# Altium footprint library UWRT_Footprint_Library_2020.PcbLib: 376 footprints (part 7 of 24)
Each footprint in its own frame and in the unit in brackets; x right, y up, seen from the top. Pads: shape width x height; smd on the part's side, far side on the other; paste and mask are expansions set on the pad; w line width, h text height; cw(c..) or ccw(c..) is an arc to the next point about the centre after c.
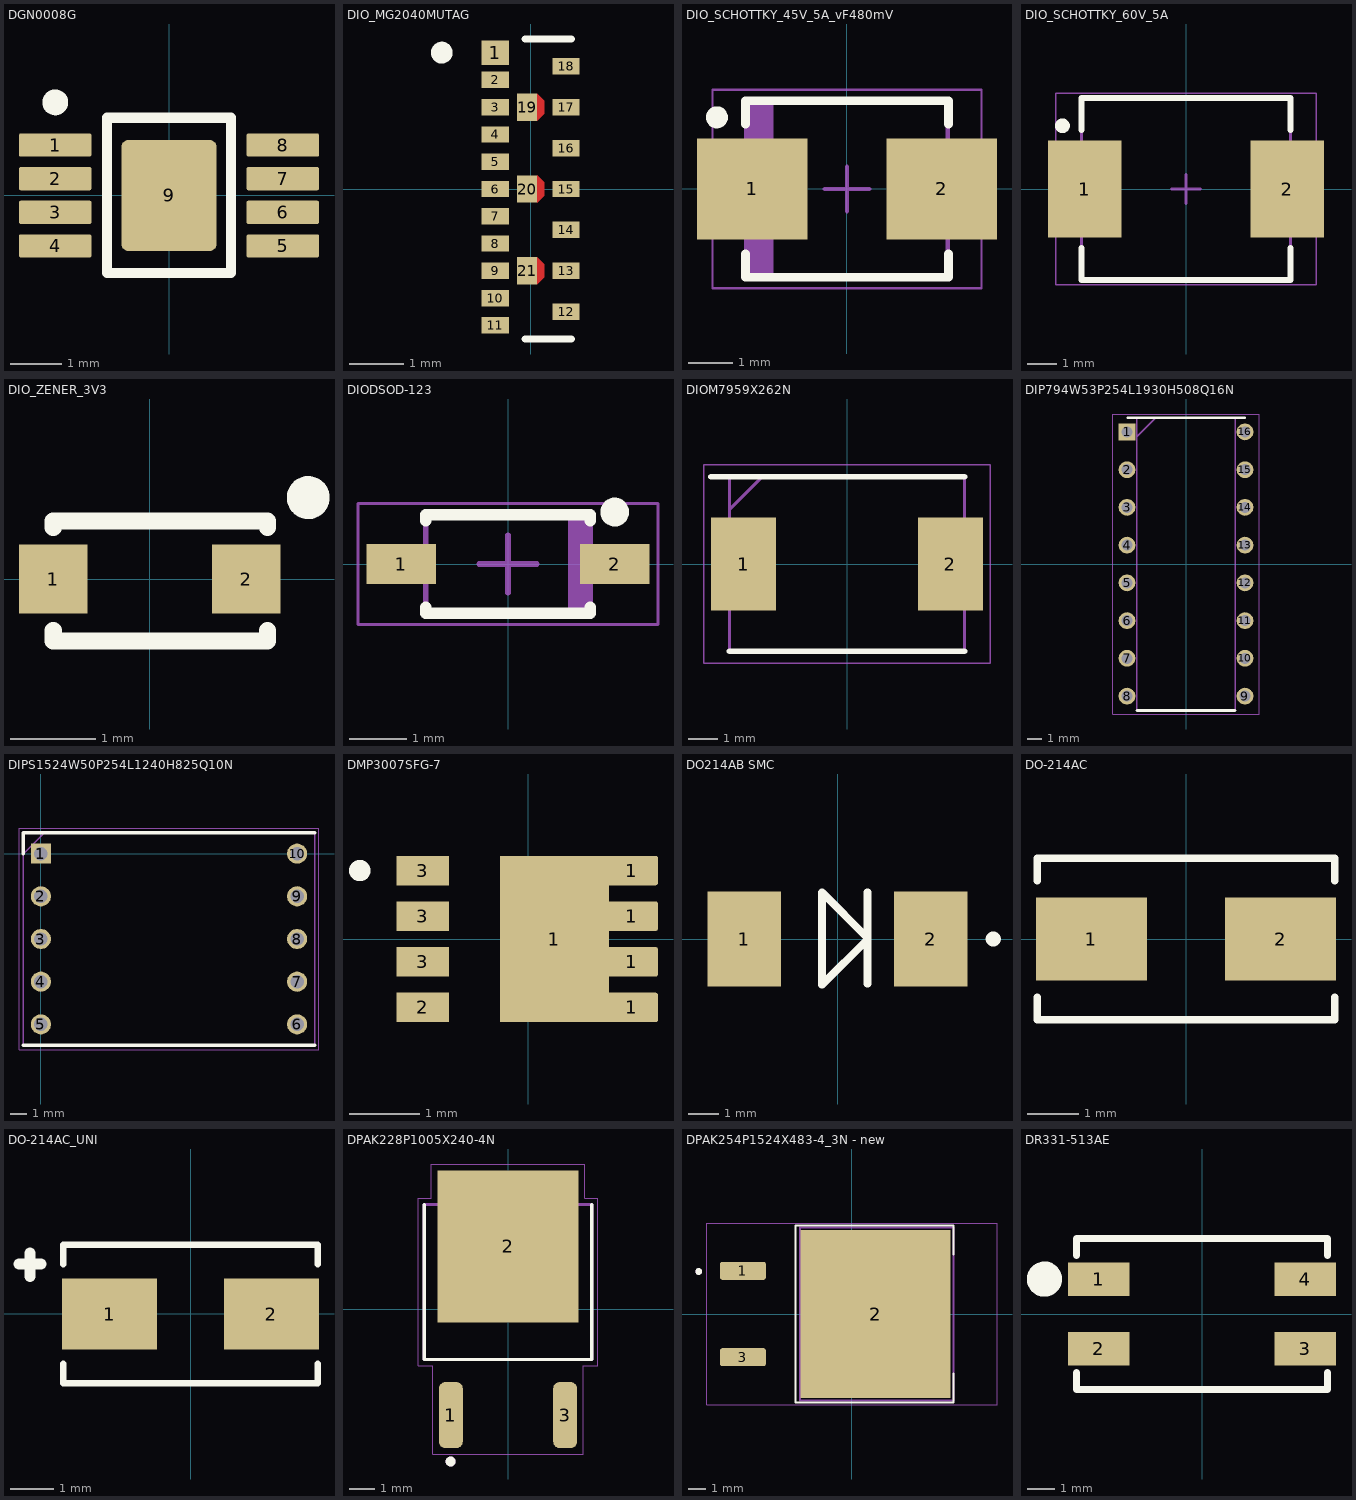
[diagram p6: the footprints below, top view; thin cyan lines are the x and y axes]

## DGN0008G [mm] "8-TSSOP, 8-MSOP (0.118\", 3.00mm Width) Exposed Pad"
height 1.1
pads (9):
  rrect15% 1.4x0.45 smd: 1(-2.2,0.975) 2(-2.2,0.325) 3(-2.2,-0.325) 4(-2.2,-0.975) 5(2.2,-0.975) 6(2.2,-0.325) 7(2.2,0.325) 8(2.2,0.975)
  rrect15% 1.846x2.15 smd: 9(0,0)
Top Overlay:
  circle w0.25: c-2.2,1.8 r0.125
  lines w0.2: -1.2,-1.5 -1.2,1.5 1.2,1.5 1.2,-1.5 -1.2,-1.5
Mechanical 15:
  lines w0.1: -0.5,0 0.5,0 ; 0,-0.5 0,0.5
3D body "TPS1H200AQDGNRQ1.STEP": height 1.1, standoff 0, extent -2.45,-1.5 2.45,1.5

## DIO_MG2040MUTAG [mm]
pads (21):
  rect 0.5x0.45 smd: 1(-0.65,2.5)
  rect 0.5x0.3 smd: 2(-0.65,2) 3(-0.65,1.5) 4(-0.65,1) 5(-0.65,0.5) 6(-0.65,0) 7(-0.65,-0.5) 8(-0.65,-1) 9(-0.65,-1.5) 10(-0.65,-2) 11(-0.65,-2.5) 12(0.65,-2.25) 13(0.65,-1.5) 14(0.65,-0.75) 15(0.65,0) 16(0.65,0.75) 17(0.65,1.5) 18(0.65,2.25)
  rect 0.37x0.5 smd mask+0: 19(-0.065,1.5) 20(-0.065,0) 21(-0.065,-1.5)
Top Layer:
  region: 0.25,-1.38 0.25,-1.62 0.12,-1.75 0.12,-1.25
  region: 0.25,0.12 0.25,-0.12 0.12,-0.25 0.12,0.25
  region: 0.25,1.62 0.25,1.38 0.12,1.25 0.12,1.75
Top Overlay:
  circle w0.2: c-1.63,2.5 r0.1
  lines w0.127: -0.1,-2.75 0.75,-2.75 ; -0.1,2.75 0.75,2.75
Top Paste:
  region: 0.25,-1.38 0.25,-1.62 0.12,-1.75 0.12,-1.25
  region: 0.25,1.62 0.25,1.38 0.12,1.25 0.12,1.75
  region: 0.25,0.12 0.25,-0.12 0.12,-0.25 0.12,0.25
Top Solder:
  region: 0.35,1.62 0.35,1.38 0.12,1.15 -0.35,1.15 -0.35,1.85 0.12,1.85
  region: 0.35,-1.38 0.35,-1.62 0.12,-1.85 -0.35,-1.85 -0.35,-1.15 0.12,-1.15
  region: 0.35,0.12 0.35,-0.12 0.12,-0.35 -0.35,-0.35 -0.35,0.35 0.12,0.35

## DIO_SCHOTTKY_45V_5A_vF480mV [mm] "Molded Diode, 2-Leads, Body 4.31x3.62mm, IPC Medium Density"
height 2.44
pads (2):
  rect 2.5x2.3 smd: 1(-2.15,0) 2(2.15,0)
Top Overlay:
  circle w0.25: c-2.95,1.625 r0.125
  lines w0.2: -2.3,-1.475 -2.3,-2 2.3,-2 2.3,-1.475 ; -2.3,1.475 -2.3,2 2.3,2 2.3,1.475
Mechanical 13:
  rectangle: -2.285,-1.97 -1.67,1.97
  lines w0.1: -2.285,-1.97 -2.285,1.97 2.285,1.97 2.285,-1.97 -2.285,-1.97
Mechanical 15:
  lines w0.05: -3.05,-2.25 -3.05,2.25 3.05,2.25 3.05,-2.25 -3.05,-2.25
  lines w0.1: -0.5,0 0.5,0 ; 0,-0.5 0,0.5
3D body: height 2.44, standoff 0, extent -2.285,-1.97 2.285,1.97

## DIO_SCHOTTKY_60V_5A [mm] "SODFL, 2-Leads, Body 5.91x7.94mm, IPC Medium Density"
height 2.5
pads (2):
  rect 2.5x3.3 smd: 1(-3.45,0) 2(3.45,0)
Top Overlay:
  circle w0.25: c-4.2,2.15 r0.125
  lines w0.2: -3.55,-2 -3.55,-3.1 3.55,-3.1 3.55,-2 ; -3.55,2 -3.55,3.1 3.55,3.1 3.55,2
Mechanical 13:
  lines w0.1: -3.555,-3.11 3.555,-3.11 3.555,3.11 -3.555,3.11 -3.555,-3.11
Mechanical 15:
  lines w0.05: -4.425,-3.25 4.425,-3.25 4.425,3.25 -4.425,3.25 -4.425,-3.25
  lines w0.1: -0.5,0 0.5,0 ; 0,-0.5 0,0.5
3D body: height 2.5, standoff 0, extent -3.555,-3.11 3.555,3.11

## DIO_ZENER_3V3 [mm] "DIODE ZENER 3.3V 200MW SOD323F"
pads (2):
  rect 0.8x0.8 smd: 1(-1.125,0) 2(1.125,0)
Top Overlay:
  circle w0.25: c1.85,0.95 r0.125
  lines w0.2: -1.125,-0.6 -1.125,-0.725 1.375,-0.725 1.375,-0.6 ; -1.125,0.6 -1.125,0.675 1.375,0.675 1.375,0.6
3D body "1N914BWS--3DModel-STEP-56544.STEP": height 0.91, standoff 0.01, extent -1.125,-0.625 1.375,0.625

## DIODSOD-123 [mm] "SOD-123, 2-Leads, Body 2.85x1.7mm (max), Pitch 3.7mm"
height 1.45
pads (2):
  rect 1.2x0.7 smd: 1(-1.85,0) 2(1.85,0)
Top Overlay:
  circle w0.25: c1.85,0.9 r0.125
  lines w0.2: -1.425,-0.75 -1.425,-0.85 1.425,-0.85 1.425,-0.75 ; -1.425,0.75 -1.425,0.85 1.425,0.85 1.425,0.75
Mechanical 13:
  rectangle: 1.042,-0.85 1.425,0.85
  lines w0.1: -1.425,-0.85 -1.425,0.85 1.425,0.85 1.425,-0.85 -1.425,-0.85
Mechanical 15:
  lines w0.05: -2.6,-1.05 -2.6,1.05 2.6,1.05 2.6,-1.05 -2.6,-1.05
  lines w0.1: -0.5,0 0.5,0 ; 0,-0.5 0,0.5
3D body: height 1.45, standoff 0, extent -1.425,-0.85 1.425,0.85

## DIOM7959X262N [mm]
pads (2):
  rect 2.2x3.15 smd: 1(-3.5,0) 2(3.5,0)
Top Overlay:
  lines w0.2: -4.6,2.952 3.97,2.952 ; -3.97,-2.952 3.97,-2.952
Mechanical 13:
  lines w0.1: -3.97,1.852 -2.87,2.952 ; -3.97,-2.952 3.97,-2.952 3.97,2.952 -3.97,2.952 -3.97,-2.952
Mechanical 15:
  lines w0.05: -4.85,-3.36 4.85,-3.36 4.85,3.36 -4.85,3.36 -4.85,-3.36
3D body "SK54L-TP.stp": height 2.62, standoff 0, extent -3.97,-2.953 3.97,2.953

## DIP794W53P254L1930H508Q16N [mm]
pads (16):
  rect 1.13x1.13 hole 0.73: 1(-3.97,8.89)
  round 1.13 hole 0.73: 2(-3.97,6.35) 3(-3.97,3.81) 4(-3.97,1.27) 5(-3.97,-1.27) 6(-3.97,-3.81) 7(-3.97,-6.35) 8(-3.97,-8.89) 9(3.97,-8.89) 10(3.97,-6.35) 11(3.97,-3.81) 12(3.97,-1.27) 13(3.97,1.27) 14(3.97,3.81) 15(3.97,6.35) 16(3.97,8.89)
Top Overlay:
  lines w0.2: -3.898,9.842 3.937,9.842 ; -3.3,-9.845 3.3,-9.845
Mechanical 13:
  lines w0.1: -3.3,8.575 -2.03,9.845 ; -3.3,-9.845 3.3,-9.845 3.3,9.845 -3.3,9.845 -3.3,-9.845
Mechanical 15:
  lines w0.05: -4.945,-10.095 4.945,-10.095 4.945,10.095 -4.945,10.095 -4.945,-10.095
3D body "CD4511BE.stp": height 5.27, standoff -3.1, extent -3.937,-9.842 3.937,9.842

## DIPS1524W50P254L1240H825Q10N [mm]
pads (10):
  rect 1.2x1.2 hole 0.8: 1(0,0)
  round 1.2 hole 0.8: 2(0,-2.54) 3(0,-5.08) 4(0,-7.62) 5(0,-10.16) 6(15.24,-10.16) 7(15.24,-7.62) 8(15.24,-5.08) 9(15.24,-2.54) 10(15.24,0)
Top Overlay:
  lines w0.2: -1.055,-11.405 16.295,-11.405 ; -1.055,0 -1.055,1.245 16.295,1.245
Mechanical 13:
  lines w0.1: -1.055,-0.025 0.215,1.245 ; -1.055,-11.405 -1.055,1.245 16.295,1.245 16.295,-11.405 -1.055,-11.405
Mechanical 15:
  lines w0.05: -1.305,-11.655 -1.305,1.495 16.545,1.495 16.545,-11.655 -1.305,-11.655
3D body "User Library-DISPLAY LED 7-SEG 0,56 RED 632NM CC.SLDPRT": height 8, standoff -4.5, extent -0.95,-11.2 16.15,1.2

## DMP3007SFG-7 [mm]
pads (9):
  rect 1.55x2.37 smd: 1(0.375,0)
  rrect15% 0.75x0.42 smd: 1(1.475,-0.975) 1(1.475,-0.325) 1(1.475,0.325) 1(1.475,0.975)
  rect 0.75x0.42 smd: 2(-1.5,-0.975) 3(-1.5,-0.325) 3(-1.5,0.325) 3(-1.5,0.975)
Top Overlay:
  circle w0.254: c-2.4,0.975 r0.025

## DO214AB SMC [mm] "Molded Diode, 2-Leads, Body 6.85x5.90mm, IPC Medium Density"
height 2.62
pads (2):
  rect 2.45x3.15 smd: 1(-3.1,0) 2(3.1,0)
Top Overlay:
  circle w0.25: c5.182,0 r0.125
  lines w0.254: -0.516,1.524 -0.516,-1.524 1,-0.008 ; -0.516,1.548 1,0.032 ; 1,-1.492 1,1.556
3D body "SMC.STEP": height 2.6, standoff 0, extent -3.97,-2.952 3.97,2.952

## DO-214AC [mm] "SMA"
pads (2):
  rect 2.18x1.63 smd: 1(-1.857,0) 2(1.857,0)
Top Overlay:
  lines w0.152: -2.922,-1.148 -2.922,-1.587 2.922,-1.587 2.922,-1.148 ; -2.922,1.148 -2.922,1.587 2.922,1.587 2.922,1.148
3D body "User Library-DO-214AC SMA.step": height 2.38, standoff -0.02, extent -2.6,-1.3 2.6,1.3
3D body: height 0.25, standoff 0, extent 0,0 0.254,0.254

## DO-214AC_UNI [mm]
pads (2):
  rect 2.18x1.63 smd: 1(-1.857,0) 2(1.857,0)
Top Overlay:
  lines w0.152: -2.922,-1.148 -2.922,-1.587 2.922,-1.587 2.922,-1.148 ; -2.922,1.148 -2.922,1.587 2.922,1.587 2.922,1.148
  lines w0.254: -3.937,1.148 -3.429,1.148 ; -3.683,0.864 -3.683,1.402
3D body "User Library-DO-214AC SMA.step": height 2.38, standoff -0.02, extent -2.6,-1.3 2.6,1.3
3D body: height 0.25, standoff 0, extent 0,0 0.254,0.254

## DPAK228P1005X240-4N [mm]
pads (3):
  rrect50% 0.95x2.64 smd: 1(-2.286,-4.24) 3(2.286,-4.24)
  rect 5.63x6.09 smd paste-4: 2(0,2.51)
Top Overlay:
  circle w0.2: c-2.3,-6.1 r0.1
  lines w0.127: -3.35,4.185 -3.35,-2.015 3.35,-2.015 3.35,4.185
Bottom Overlay:
  lines w0.127: 3.35,-2.015 3.35,4.185
Top Paste:
  region: 0.655,1.78 -0.655,1.78 -0.655,3.24 0.655,3.24
  region: 0.655,3.81 -0.655,3.81 -0.655,5.27 0.655,5.27
  region: 0.655,-0.25 -0.655,-0.25 -0.655,1.21 0.655,1.21
  region: -1.225,3.81 -2.535,3.81 -2.535,5.27 -1.225,5.27
  region: -1.225,1.78 -2.535,1.78 -2.535,3.24 -1.225,3.24
  region: -1.225,-0.25 -2.535,-0.25 -2.535,1.21 -1.225,1.21
  region: 2.535,-0.25 1.225,-0.25 1.225,1.21 2.535,1.21
  region: 2.535,3.81 1.225,3.81 1.225,5.27 2.535,5.27
  region: 2.535,1.78 1.225,1.78 1.225,3.24 2.535,3.24
Mechanical 13:
  circle w0.2: c-2.3,-6.1 r0.1
  lines w0.127: -3.35,-2.015 3.35,-2.015 3.35,4.185 -3.35,4.185 -3.35,-2.015
Mechanical 15:
  lines w0.05: -3.6,-2.27 -3.6,4.44 -3.065,4.44 -3.065,5.81 3.065,5.81 3.065,4.44 3.6,4.44 3.6,-2.27 3.02,-2.27 3.02,-5.81 -3.02,-5.81 -3.02,-2.27 -3.6,-2.27
3D body "SBRD10200TR--3DModel-STEP-56544 (1).STEP": height 2.4, standoff 0, extent -3.3,-4.725 3.3,5.325

## DPAK254P1524X483-4_3N - new [mm]
height 4.83
pads (3):
  rrect25% 2.7x1.06 smd: 1(-6.4,2.54) 3(-6.4,-2.54)
  rect 8.8x9.9 smd: 2(1.397,0)
Top Overlay:
  circle w0.2: c-9,2.5 r0.1
  lines w0.127: 5.973,-3.515 5.973,-5.2 -3.3,-5.2 -3.3,5.2 5.973,5.2 5.973,3.515
Mechanical 13:
  circle w0.2: c-9,2.5 r0.1
  lines w0.127: -3.043,-5.08 -3.043,5.08 5.973,5.08 5.973,-5.08 -3.043,-5.08
Mechanical 15:
  lines w0.05: -8.54,-5.33 8.54,-5.33 8.54,5.33 -8.54,5.33 -8.54,-5.33
3D body "step_temp.STEP": height 4.83, standoff -0.25, extent -7.62,-5.08 7.62,5.08

## DR331-513AE [mm] "CMC"
height 3.7
pads (4):
  rect 2.2x1.2 smd: 1(-3.7,1.25) 2(-3.7,-1.25) 3(3.7,-1.25) 4(3.7,1.25)
Top Overlay:
  circle w0.654: c-5.65,1.25 r0.304
  lines w0.254: -4.5,-2.1 -4.5,-2.7 4.5,-2.7 4.5,-2.1 ; -4.5,2.1 -4.5,2.7 4.5,2.7 4.5,2.1
3D body "dr331.stp": height 5.01, standoff 0.01, extent -4.5,-2.7 4.5,2.7